# Altium footprint library NEW.PcbLib: 53 footprints (part 4 of 4)
Each footprint in its own frame and in the unit in brackets; x right, y up, seen from the top. Pads: shape width x height; smd on the part's side, far side on the other; paste and mask are expansions set on the pad; w line width, h text height; cw(c..) or ccw(c..) is an arc to the next point about the centre after c.
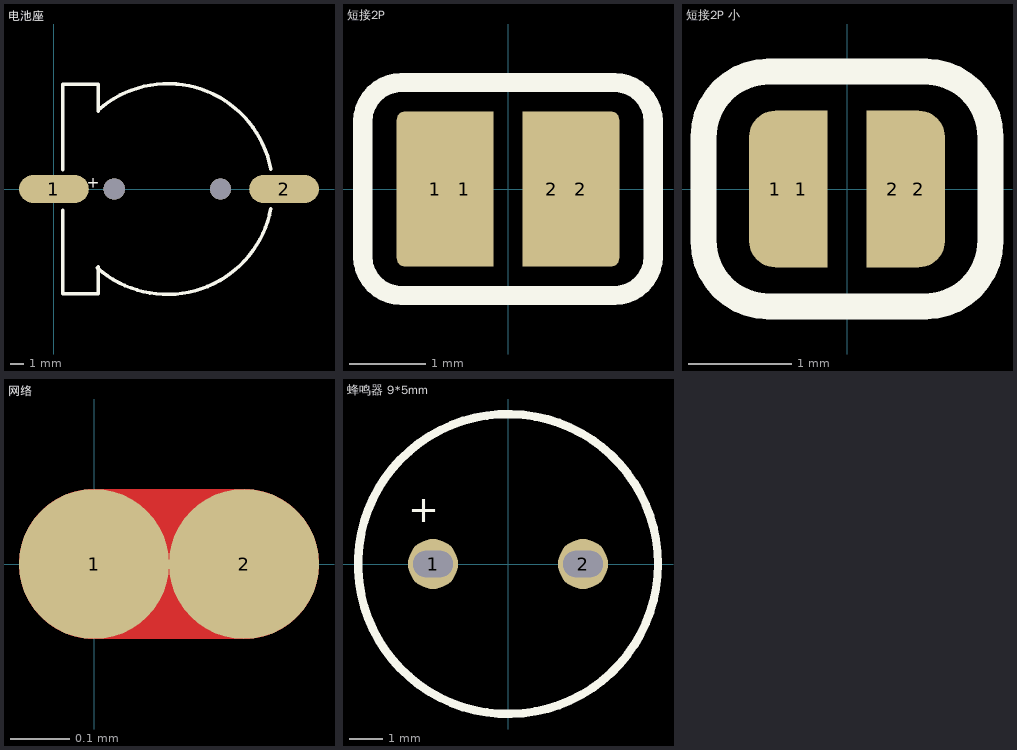
[diagram p3: the footprints below, top view; thin cyan lines are the x and y axes]

## 电池座 [mm]
height 5
pads (2):
  oval 5x2 smd: 1(0,0) 2(16.5,0)
via 11.938,0 diameter 1.524 hole 1.524
via 4.318,0 diameter 1.524 hole 1.524
Top Overlay:
  lines w0.254: 0.635,-1.524 0.635,-7.493 3.175,-7.493 3.175,-5.588 ; 0.635,1.397 0.635,7.493 3.175,7.493 3.175,5.588 ; 3.115,-5.655 ccw(c8.128,0) 15.553,-1.408 ; 3.175,5.659 cw(c8.159,0.035) 15.543,1.43
  text "+" at 3.302,0.762 h0.81
3D body: height 3.94, standoff -1, extent -1,-7.5 17.5,7.497

## 短接2P [mil]
pads (4):
  rrect20% 40x80 smd: 1(-37.5,0) 2(37.5,0)
  rect 30x80 smd: 1(-22.5,0) 2(22.5,0)
Top Overlay:
  lines w10: -75,-35 ccw(c-55,-35) -55,-55 0,-55 55,-55 ccw(c55,-35) 75,-35 75,0 75,35 ccw(c55,35) 55,55 0,55 -55,55 ccw(c-55,35) -75,35 -75,0 -75,-35
Top Solder:
  rectangle: -4,-44 4,44

## 短接2P 小 [mil]
pads (4):
  oval 20x60 smd: 1(-27.5,0) 2(27.5,0)
  rect 20x60 smd: 1(-17.5,0) 2(17.5,0)
Top Overlay:
  lines w10: -55,-20 ccw(c-30,-20) -30,-45 0,-45 30,-45 ccw(c30,-20) 55,-20 55,20 ccw(c30,20) 30,45 0,45 -30,45 ccw(c-30,20) -55,20 -55,-20
Top Solder:
  rectangle: -4,-34 4,34

## 网络 [mil]
pads (2):
  round 10 smd paste-5: 1(0,0) 2(10,0)
Top Layer:
  lines w10: 0,0 10,0

## 蜂鸣器 9*5mm [mm]
height 5
pads (2):
  round 1.5 / inner round 1.5 / far side round 2 hole 0.8 slot 1.2 at 0 deg: 1(-2.25,0) 2(2.25,0)
Top Overlay:
  circle w0.254: c0,0 r4.5
  text "+" at -3,1.25 h0.81
3D body: height 5.6, standoff -3.9, extent -5,-5 5,5